# Altium footprint library Pasivos.PcbLib: 138 footprints (part 5 of 9)
Each footprint in its own frame and in the unit in brackets; x right, y up, seen from the top. Pads: shape width x height; smd on the part's side, far side on the other; paste and mask are expansions set on the pad; w line width, h text height; cw(c..) or ccw(c..) is an arc to the next point about the centre after c.
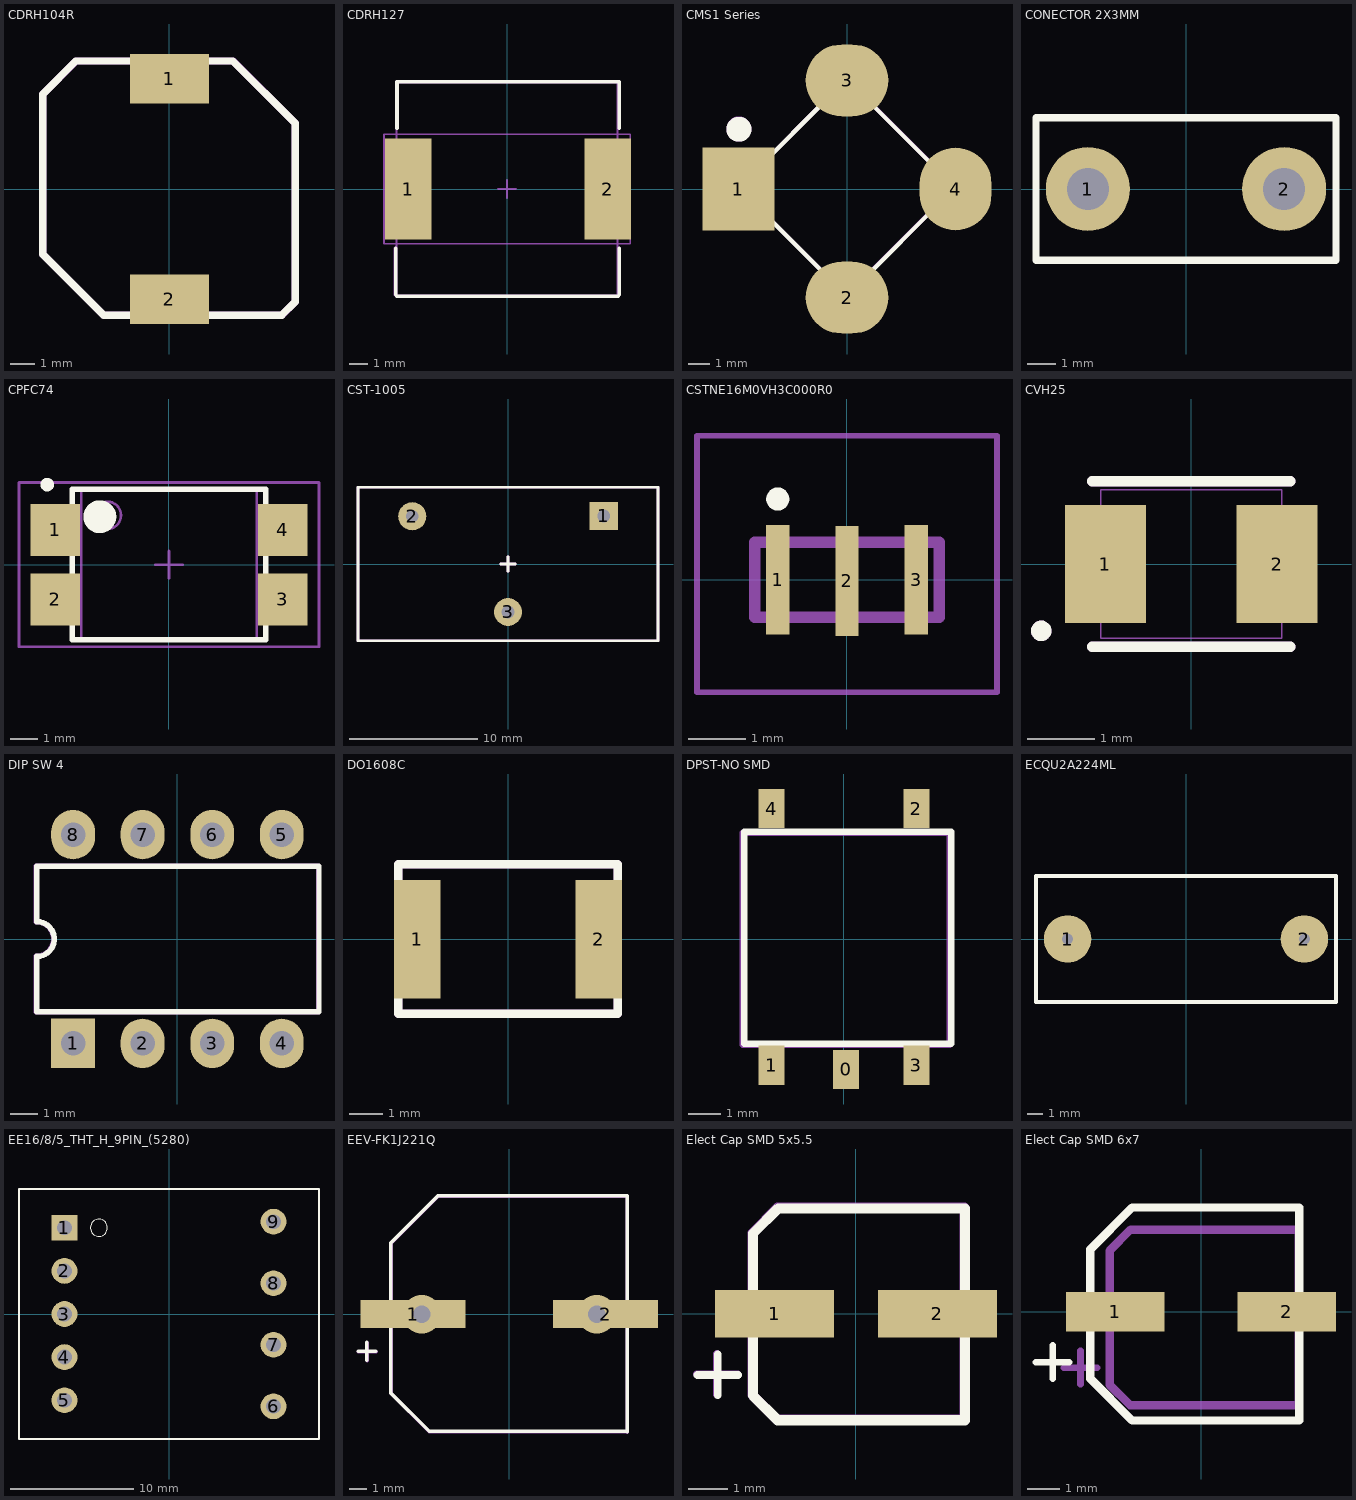
[diagram p4: the footprints below, top view; thin cyan lines are the x and y axes]

## CDRH104R [mm] "SMD Power Inductor"
pads (2):
  rect 3.2x2 smd: 1(0,4.47) 2(0,-4.47)
Top Overlay:
  lines w0.3: -5.13,-2.64 -2.66,-5.11 4.54,-5.11 5.09,-4.56 5.09,2.66 2.57,5.18 -3.78,5.18 -5.13,3.83 -5.13,-2.64
Mechanical 29:
  lines w0.3: -5.119,-2.64 -5.119,3.83 -3.769,5.18 2.581,5.18 5.101,2.66 5.101,-4.56 4.551,-5.11 -2.649,-5.11 -5.119,-2.64
  text "'.Designator'" at -2.555,-0.151 h0.5
Mechanical 30:
  lines w0.3: -5.13,-2.64 -5.13,3.83 -3.78,5.18 2.57,5.18 5.09,2.66 5.09,-4.56 4.54,-5.11 -2.66,-5.11 -5.13,-2.64
3D body "MSS1038.step": height 4, standoff 0, extent -5.1,-5.14 5.1,5.16

## CDRH127 [mm] "POWER INDUCTORS SMD Type"
height 8
pads (2):
  rect 2.6x5.6 smd: 1(-5.5,0) 2(5.6,0)
Top Overlay:
  lines w0.2: -6.2,-5.896 -6.2,-3.302 ; -6.127,-5.969 6.173,-5.969 ; -6.127,3.375 -6.127,5.969 6.173,5.969 ; 6.246,-5.896 6.246,-3.302 ; 6.246,3.375 6.246,5.969
Mechanical 13:
  lines w0.1: -6.15,-5.969 -6.15,5.969 6.15,5.969 6.15,-5.969 -6.15,-5.969
Mechanical 15:
  lines w0.1: -0.5,0 0.5,0 ; 0,-0.5 0,0.5 ; -6.85,-3.05 -6.85,3.05 6.85,3.05 6.85,-3.05 -6.85,-3.05
Mechanical 29:
  lines w0.2: -6.223,-5.896 -6.223,-3.302 ; -6.15,-5.969 6.15,-5.969 ; -6.15,3.375 -6.15,5.969 6.15,5.969 ; 6.223,-5.896 6.223,-3.302 ; 6.223,3.375 6.223,5.969
  text "'.Designator'" at -2.921,-0.16 h0.5
3D body "CDRH127.step": height 7.45, standoff 0, extent -6.223,-6 6.119,6

## CMS1 Series [mm] "Common Mode Choke"
pads (4):
  rect 3.3x3.8 smd: 1(-4.98,0)
  oval 3.8x3.3 smd: 2(0,-4.98) 3(0,4.98)
  oval 3.3x3.8 smd: 4(4.98,0)
Top Layer:
  lines w0.2: -4.98,0 -4.98,0.07
Top Overlay:
  circle w1: c-4.959,2.74 r0.072
  lines w0.2: -4.977,0.06 -0.007,5.03 0.003,5.02 4.958,0.065 0.063,-4.83 -0.087,-4.83 -4.977,0.06
Mechanical 29:
  circle w1: c-4.962,2.75 r0.072
  lines w0.2: -4.98,0.07 -0.09,-4.82 0.06,-4.82 4.955,0.075 0,5.03 -0.01,5.04 -4.98,0.07
  text "'.Designator'" at -2.97,-0.137 h0.5
3D body "SMS2.STEP": height 6, standoff 0, extent -5.585,-5.705 5.845,5.725

## CONECTOR 2X3MM [mm]
pads (2):
  round 3 hole 1.5: 1(-3.5,0) 2(3.5,0)
Top Overlay:
  lines w0.254: -5.35,-2.54 5.35,-2.54 5.35,2.54 -5.35,2.54 -5.35,-2.54

## CPFC74 [mm] "DC COMMON MODE CHOKE COIL"
height 5.08
pads (4):
  rect 1.8x1.9 smd: 1(-4.15,1.27) 2(-4.15,-1.27) 3(4.15,-1.27) 4(4.15,1.27)
Top Overlay:
  circle w0.6: c-2.525,1.75 r0.3
  circle w0.25: c-4.443,2.921 r0.125
  lines w0.2: -3.525,-2.75 3.525,-2.75 3.525,2.75 -3.525,2.75 -3.525,-2.75
Mechanical 15:
  lines w0.1: -0.5,0 0.5,0 ; 0,-0.5 0,0.5 ; -5.475,-3 5.475,-3 5.475,3 -5.475,3 -5.475,-3
Mechanical 29:
  circle w0.1: c-2.25,1.8 r0.5
  lines w0.1: -3.2,-2.75 3.2,-2.75 3.2,2.75 -3.2,2.75 -3.2,-2.75
  text "'.Designator'" at -2.808,-0.225 h0.5
3D body "CPFC74.STEP": height 5.59, standoff 0, extent -4.699,-2.413 4.801,2.413

## CST-1005 [mm] "50/60 Hz Current Sense Transformers"
pads (3):
  rect 2.2x2.2 hole 1: 1(7.5,3.76)
  round 2.2 hole 1: 2(-7.5,3.74) 3(0,-3.76)
Top Overlay:
  lines w0.2: -0.58,0 0.56,0 ; 0,-0.58 0,0.56 ; -11.75,-6 11.75,-6 11.75,6 -11.75,6 -11.75,-6
Mechanical 29:
  lines w0.2: -0.58,0 0.56,0 ; 0,-0.58 0,0.56 ; -11.75,-6 -11.75,6 11.75,6 11.75,-6 -11.75,-6
  text "'.Designator'" at -0.359,-0.096 h0.5
3D body "CST-1005.STEP": height 24.83, standoff -1.97, extent -11.84,-5.96 11.66,6.04

## CSTNE16M0VH3C000R0 [mm] "Pitch 1.2mm"
pads (3):
  rect 0.4x1.9 smd: 1(-1.2,0) 2(0,-0.019) 3(1.2,0)
Top Overlay:
  lines w0.2: -1.3,1.4 cw(c-1.2,1.4) -1.1,1.4 cw(c-1.2,1.4) -1.3,1.4
Mechanical 13:
  lines w0.2: -1.6,-0.65 1.6,-0.65 1.6,0.65 -1.6,0.65 -1.6,-0.65
Mechanical 15:
  lines w0.1: -2.6,-1.95 2.6,-1.95 2.6,2.5 -2.6,2.5 -2.6,-1.95
3D body "CSTCE16M0V53-R0.step": height 0.88, standoff -0.02, extent -1.6,-0.669 1.6,0.631

## CVH25 [mil] "CVH252009 Series"
pads (2):
  rect 47.5x69 smd: 1(-50.25,0) 2(50.25,0)
Top Overlay:
  circle w6: c-87.9,-39.14 r3
  lines w6: -57.95,-48.5 58.05,-48.5 ; -57.95,48.5 58.05,48.5
Mechanical 1:
  circle w1: c-50,0 r3
  lines w1: -53,-43.5 -53,43.5 53,43.5 53,-43.5 -53,-43.5
Mechanical 29:
  circle w6: c-87.95,-39.14 r3
  lines w6: -58,-48.5 58,-48.5 ; -58,48.5 58,48.5
  text "'.Designator'" at -57.48,-5.03 h19.68

## DIP SW 4 [mm]
pads (8):
  rect 1.6x1.8 hole 0.9: 1(-3.81,-3.81)
  oval 1.6x1.8 hole 0.9: 2(-1.27,-3.81) 3(1.27,-3.81) 4(3.81,-3.81) 5(3.81,3.81) 6(1.27,3.81) 7(-1.27,3.81) 8(-3.81,3.81)
Top Overlay:
  lines w0.2: -5.132,-2.652 5.168,-2.652 5.168,2.648 -5.132,2.648 -5.132,0.633 cw(c-5.132,-0.002) -5.132,-0.637 -5.132,-2.652
Mechanical 29:
  lines w0.2: -5.15,-2.65 -5.15,-0.635 ccw(c-5.15,0) -5.15,0.635 -5.15,2.65 5.15,2.65 5.15,-2.65 -5.15,-2.65
  text "'.Designator'" at -3.017,-0.084 h0.5
3D body "SW3dPS-DIPSWITCH.STEP": height 6.9, standoff -3.2, extent -5.89,-5.13 5.79,5.03

## DO1608C [mm] "SMT Power Inductors"
pads (2):
  rect 1.4x3.56 smd: 1(-2.73,0) 2(2.73,0)
Top Overlay:
  lines w0.254: -3.299,-2.246 3.301,-2.246 3.301,2.254 -3.299,2.254 -3.299,-2.246
Mechanical 29:
  lines w0.254: -3.3,-2.25 -3.3,2.25 3.3,2.25 3.3,-2.25 -3.3,-2.25
  text "'.Designator'" at -2.792,-0.19 h0.5
3D body "Coilcraft-DO1608C.step": height 2.92, standoff -0.01, extent -3.35,-2.265 3.25,2.185

## DPST-NO SMD [mm] "PushBtn"
pads (5):
  rect 0.8x1.2 smd: 0(0.064,-4) 1(-2.222,-3.873) 2(2.222,4) 3(2.222,-3.873) 4(-2.222,4)
Top Overlay:
  lines w0.2: 3.286,-3.215 3.286,3.285 -3.064,3.285 -3.064,-3.215 3.296,-3.215
Mechanical 29:
  lines w0.2: 3.238,-3.238 3.238,3.261 -3.111,3.261 -3.111,-3.238 3.248,-3.238
  text "'.Designator'" at -0.368,-0.009 h0.5
3D body "Omron B3S.step": height 4.3, standoff 0, extent -4.688,-4.436 3.112,4.564

## ECQU2A224ML [mm]
pads (2):
  round 3 hole 0.7: 1(-7.5,0) 2(7.5,0)
Top Overlay:
  lines w0.254: -9.5,-4 -9.5,4 9.5,4 9.5,-4 -9.5,-4
3D body "User Library-Hua Jung MKP-394K0305AB1151-P.step": height 14.5, standoff -2.81, extent -9,-3.818 9,3.683

## EE16/8/5_THT_H_9PIN_(5280) [mil]
pads (9):
  rect 82.5x82.5 hole 47.24: 1(-334.5,276)
  round 82.5 hole 47.24: 2(-334.5,138) 3(-334.5,0) 4(-334.5,-138) 5(-334.5,-276) 6(334.5,-295.5) 7(334.5,-98.5) 8(334.5,98.5) 9(334.5,295.5)
Top Overlay:
  circle w0: c-224.5,276 r27.5
  lines w5: -480,-400 480,-400 480,400 -480,400 -480,-400
Mechanical 13:
  text "1" at -530,238.66 h73.82
  text "5" at -530,-313.34 h73.82
  text "6" at 530,-332.84 h73.82
  text "9" at 530,258.16 h73.82
  text "1" at -530,238.66 h73.82
  text "5" at -530,-313.34 h73.82
  text "6" at 530,-332.84 h73.82
  text "9" at 530,258.16 h73.82
3D body "750871530.STEP": height 610.33, standoff -90.55, extent -502.37,-394.88 447.25,392.52

## EEV-FK1J221Q [mm] "Dia (12.50mm) x 13.50mm x"
pads (2):
  rect 6x1.6 smd: 1(-5.5,0) 2(5.5,0)
via 5,0 diameter 2.2 hole 1
via -5,0 diameter 2.2 hole 1
Top Overlay:
  lines w0.2: -8.657,-2.135 -7.641,-2.135 ; -8.149,-2.643 -8.149,-1.627 ; 6.71,-6.707 -1.164,-6.707 -4.593,-6.707 -6.771,-4.529 -6.771,4.069 -4.085,6.755 6.71,6.755 ; 6.729,-6.726 6.729,6.755
Mechanical 29:
  lines w0.2: -8.636,-2.159 -7.62,-2.159 ; -8.128,-2.667 -8.128,-1.651 ; 6.731,-6.731 -1.143,-6.731 -4.572,-6.731 -6.75,-4.553 -6.75,4.045 -4.064,6.731 6.731,6.731 ; 6.75,-6.75 6.75,6.731
  text "'.Designator'" at -2.882,-0.085 h0.5
3D body "ALU-H16.step": height 17, standoff 0, extent -7.75,-6.858 7.75,6.842

## Elect Cap SMD 5x5.5 [mm]
pads (2):
  rect 3x1.2 smd: 1(-2.05,0) 2(2.05,0)
Top Overlay:
  lines w0.2: -3.986,-1.538 -2.97,-1.538 ; -3.478,-2.046 -3.478,-1.538 -3.478,-1.03 ; -1.954,2.653 2.745,2.653
  lines w0.254: 0.84,2.653 -1.954,2.653 ; -2.589,-2.063 -1.971,-2.681 -0.43,-2.681 2.745,-2.681 2.745,2.653 -1.954,2.653 ; -2.589,-2.063 -2.589,2.018 ; -2.589,-2.063 -2.589,2.018 ; -2.589,2.018 -1.954,2.653
Mechanical 29:
  lines w0.2: -4,-1.524 -2.984,-1.524 ; -3.492,-2.032 -3.492,-1.524 -3.492,-1.016 ; -1.968,2.667 2.73,2.667
  lines w0.254: 0.826,2.667 -1.968,2.667 ; -2.603,-2.049 -2.603,2.032 ; -2.603,-2.049 -2.603,2.032 ; -2.603,-2.049 -1.986,-2.667 -0.445,-2.667 2.73,-2.667 2.73,2.667 -1.968,2.667 ; -2.603,2.032 -1.968,2.667
  text "'.Designator'" at -2.169,-0.219 h0.5
3D body "CAPSMD4x5_5.STEP": height 5.52, standoff -0.4, extent -2.717,-2.144 2.922,2.175

## Elect Cap SMD 6x7 [mm]
pads (2):
  rect 3x1.2 smd: 1(-2.603,0) 2(2.603,0)
Top Overlay:
  lines w0.2: -5.016,-1.524 -4,-1.524 ; -4.508,-2.032 -4.508,-1.524 -4.508,-1.016
  lines w0.254: -1.836,-3.302 0.191,-3.302 2.984,-3.302 ; 2.984,-3.302 -2.095,-3.302 -3.365,-2.032 -3.365,1.905 -2.095,3.175 2.984,3.175 2.984,-3.302
Mechanical 29:
  lines w0.2: -4.172,-1.692 -3.156,-1.692 ; -3.664,-2.2 -3.664,-1.692 -3.664,-1.184 ; -2.14,2.499 2.559,2.499
  lines w0.254: 0.654,2.499 -2.14,2.499 ; -2.775,-2.217 -2.157,-2.835 -0.616,-2.835 2.975,-2.835 2.975,2.499 -2.14,2.499 ; -2.775,-2.217 -2.775,1.864 ; -2.775,-2.217 -2.775,1.864 ; -2.775,1.864 -2.14,2.499
  text "'.Designator'" at -2.34,-0.386 h0.5
3D body "E-cap_H.step": height 7.7, standoff 0, extent -3.84,-3.3 3.46,3.3